# Altium footprint library 开关_按键封装库.PcbLib: 175 footprints (part 1 of 11)
Each footprint in its own frame and in the unit in brackets; x right, y up, seen from the top. Pads: shape width x height; smd on the part's side, far side on the other; paste and mask are expansions set on the pad; w line width, h text height; cw(c..) or ccw(c..) is an arc to the next point about the centre after c.
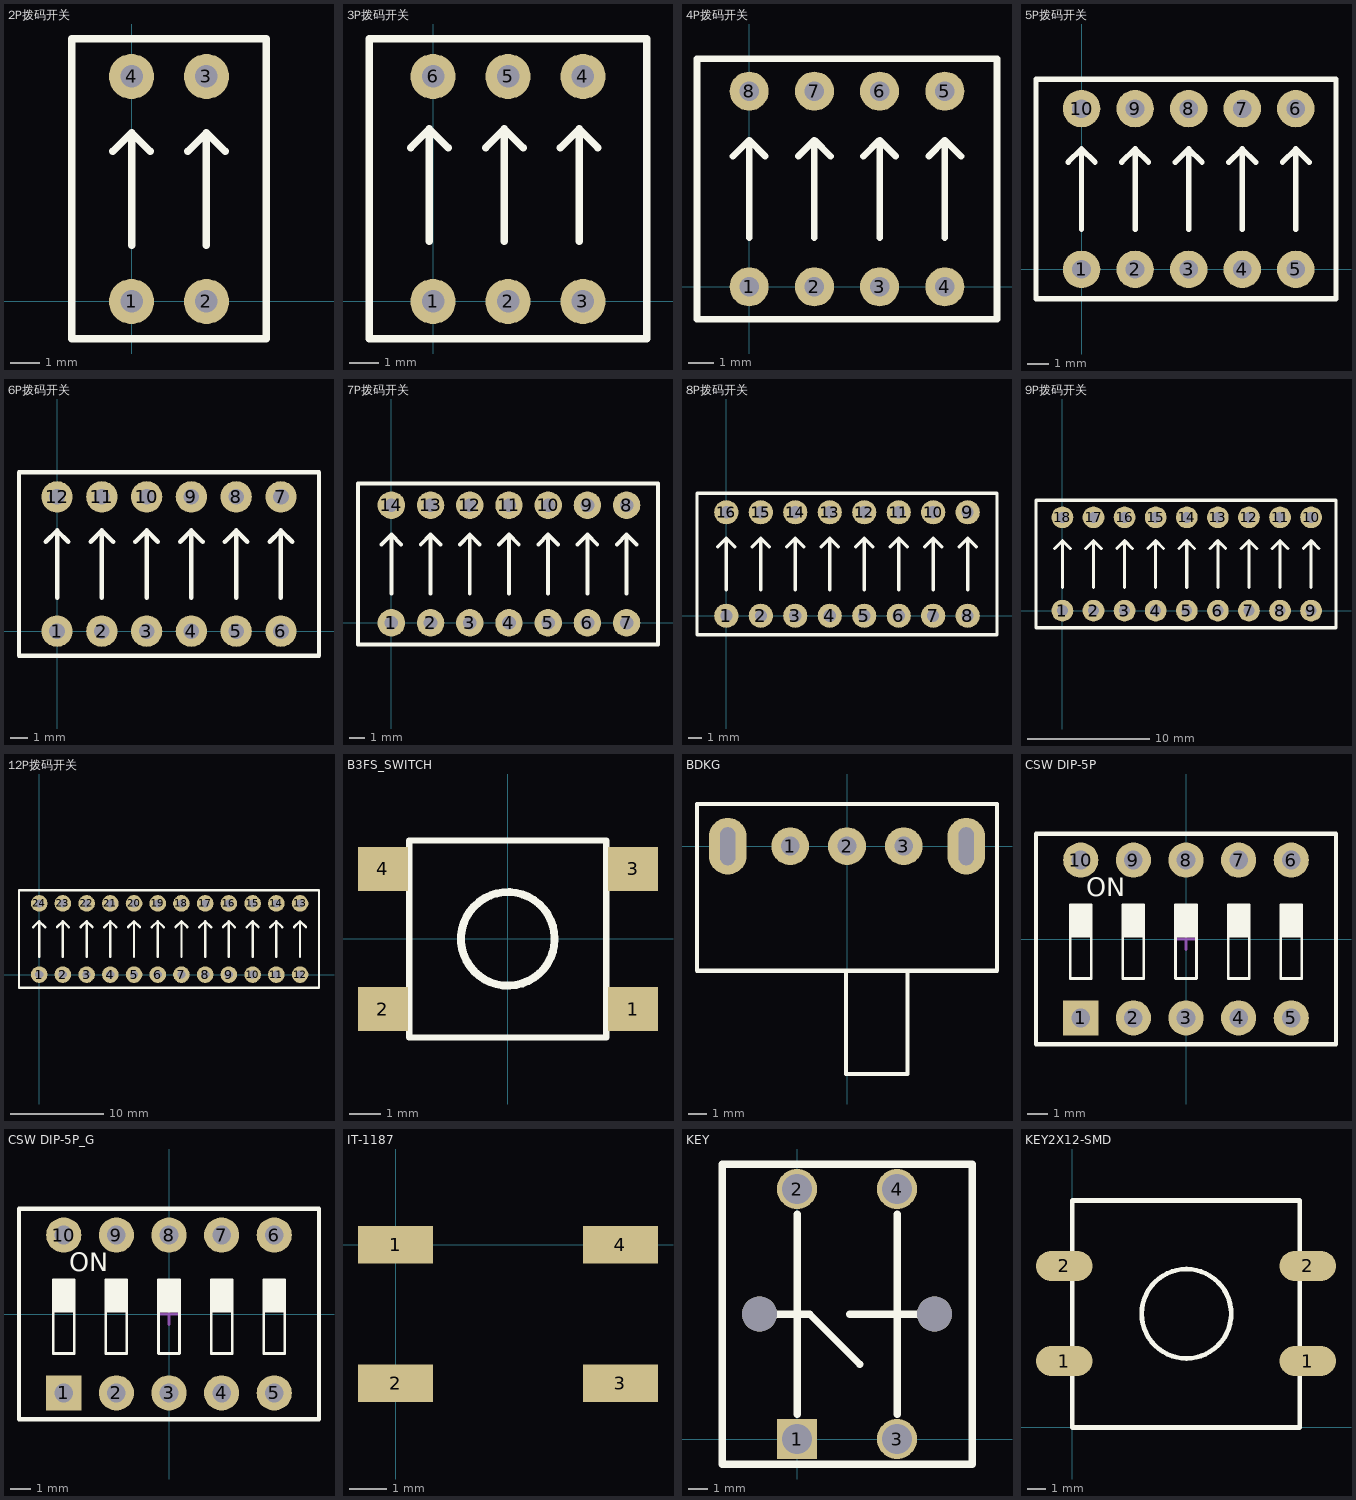
[diagram p0: the footprints below, top view; thin cyan lines are the x and y axes]

## 2P拨码开关 [mil]
pads (4):
  round 60 hole 30: 1(0,0) 2(100,0) 3(100,300) 4(0,300)
Top Overlay:
  lines w10: -25,200 0,225 ; 0,75 0,225 ; 25,200 0,225 ; 75,200 100,225 ; 100,75 100,225 ; 125,200 100,225 ; -80,-50 180,-50 180,350 -80,350 -80,-50
3D body "SW3dPS-DIPSWITCH.STEP": height 271.65, standoff -125.98, extent -79.92,-50 179.92,350

## 3P拨码开关 [mil]
pads (6):
  round 60 hole 30: 1(0,0) 2(100,0) 3(200,0) 4(200,300) 5(100,300) 6(0,300)
Top Overlay:
  lines w10: -30,205 -5,230 ; -5,80 -5,230 ; 20,205 -5,230 ; 70,205 95,230 ; 95,80 95,230 ; 120,205 95,230 ; 170,205 195,230 ; 195,80 195,230 ; 220,205 195,230 ; -85,-50 -85,350 285,350 285,-50 -85,-50
3D body "19620.stp": height 242.2, standoff -120, extent -80.7,-44.88 280.72,344.89

## 4P拨码开关 [mil]
pads (8):
  round 60 hole 30: 1(0,0) 2(100,0) 3(200,0) 4(300,0) 5(300,300) 6(200,300) 7(100,300) 8(0,300)
Top Overlay:
  lines w10: -25,200 0,225 ; 0,75 0,225 ; 25,200 0,225 ; 75,200 100,225 ; 100,75 100,225 ; 125,200 100,225 ; 175,200 200,225 ; 200,75 200,225 ; 225,200 200,225 ; 275,200 300,225 ; 300,75 300,225 ; 325,200 300,225 ; -80,-50 380,-50 380,350 -80,350 -80,-50
3D body "SW3dPS-DIPSWITCH.STEP": height 271.65, standoff -125.98, extent -79.92,-50 179.92,350
3D body "SW3dPS-DIPSWITCH.STEP": height 271.65, standoff -125.98, extent 120.08,-50 379.92,350

## 5P拨码开关 [mil]
pads (10):
  round 70 hole 35: 1(0,0) 2(100,0) 3(200,0) 4(300,0) 5(400,0) 6(400,300) 7(300,300) 8(200,300) 9(100,300) 10(0,300)
Top Overlay:
  lines w10: -25,200 0,225 ; 0,75 0,225 ; 25,200 0,225 ; 75,200 100,225 ; 100,75 100,225 ; 125,200 100,225 ; 175,200 200,225 ; 200,75 200,225 ; 225,200 200,225 ; 275,200 300,225 ; 300,75 300,225 ; 325,200 300,225 ; 375,200 400,225 ; 400,75 400,225 ; 425,200 400,225 ; -85,-55 -85,355 475,355 475,-55 -85,-55
3D body "User Library-DIP-Switch.STEP": height 275.59, standoff -145.67, extent -69.68,-45 469.68,344.77

## 6P拨码开关 [mil]
pads (12):
  round 70 hole 35: 1(0,0) 2(100,0) 3(200,0) 4(300,0) 5(400,0) 6(500,0) 7(500,300) 8(400,300) 9(300,300) 10(200,300) 11(100,300) 12(0,300)
Top Overlay:
  lines w10: -25,200 0,225 ; 0,75 0,225 ; 25,200 0,225 ; 75,200 100,225 ; 100,75 100,225 ; 125,200 100,225 ; 175,200 200,225 ; 200,75 200,225 ; 225,200 200,225 ; 275,200 300,225 ; 300,75 300,225 ; 325,200 300,225 ; 375,200 400,225 ; 400,75 400,225 ; 425,200 400,225 ; 475,200 500,225 ; 500,75 500,225 ; 525,200 500,225 ; -85,-55 -85,355 585,355 585,-55 -85,-55
3D body "User Library-DIPSWITCH (1).step": height 271.65, standoff -125.98, extent -79.92,-50 579.92,350

## 7P拨码开关 [mil]
pads (14):
  round 70 hole 35: 1(0,0) 2(100,0) 3(200,0) 4(300,0) 5(400,0) 6(500,0) 7(600,0) 8(600,300) 9(500,300) 10(400,300) 11(300,300) 12(200,300) 13(100,300) 14(0,300)
Top Overlay:
  lines w10: -25,200 0,225 ; 0,75 0,225 ; 25,200 0,225 ; 75,200 100,225 ; 100,75 100,225 ; 125,200 100,225 ; 175,200 200,225 ; 200,75 200,225 ; 225,200 200,225 ; 275,200 300,225 ; 300,75 300,225 ; 325,200 300,225 ; 375,200 400,225 ; 400,75 400,225 ; 425,200 400,225 ; 475,200 500,225 ; 500,75 500,225 ; 525,200 500,225 ; 575,200 600,225 ; 600,75 600,225 ; 625,200 600,225 ; -85,-55 -85,355 680,355 680,-55 -85,-55
3D body "User Library-DIPSWITCH7.step": height 271.65, standoff -125.98, extent -78.55,-50 675,350

## 8P拨码开关 [mil]
pads (16):
  round 70 hole 35: 1(0,0) 2(100,0) 3(200,0) 4(300,0) 5(400,0) 6(500,0) 7(600,0) 8(700,0) 9(700,300) 10(600,300) 11(500,300) 12(400,300) 13(300,300) 14(200,300) 15(100,300) 16(0,300)
Top Overlay:
  lines w10: -25,200 0,225 ; 0,75 0,225 ; 25,200 0,225 ; 75,200 100,225 ; 100,75 100,225 ; 125,200 100,225 ; 175,200 200,225 ; 200,75 200,225 ; 225,200 200,225 ; 275,200 300,225 ; 300,75 300,225 ; 325,200 300,225 ; 375,200 400,225 ; 400,75 400,225 ; 425,200 400,225 ; 475,200 500,225 ; 500,75 500,225 ; 525,200 500,225 ; 575,200 600,225 ; 600,75 600,225 ; 625,200 600,225 ; 675,200 700,225 ; 700,75 700,225 ; 725,200 700,225 ; -85,-55 785,-55 785,355 -85,355 -85,-55
3D body "User Library-DIPSWITCH8.step": height 281.65, standoff -115.98, extent -81.1,-50 781.1,350

## 9P拨码开关 [mil]
pads (18):
  round 70 hole 35: 1(0,0) 2(100,0) 3(200,0) 4(300,0) 5(400,0) 6(500,0) 7(600,0) 8(700,0) 9(800,0) 10(800,300) 11(700,300) 12(600,300) 13(500,300) 14(400,300) 15(300,300) 16(200,300) 17(100,300) 18(0,300)
Top Overlay:
  lines w10: -25,200 0,225 ; 0,75 0,225 ; 25,200 0,225 ; 75,200 100,225 ; 100,75 100,225 ; 125,200 100,225 ; 175,200 200,225 ; 200,75 200,225 ; 225,200 200,225 ; 275,200 300,225 ; 300,75 300,225 ; 325,200 300,225 ; 375,200 400,225 ; 400,75 400,225 ; 425,200 400,225 ; 475,200 500,225 ; 500,75 500,225 ; 525,200 500,225 ; 575,200 600,225 ; 600,75 600,225 ; 625,200 600,225 ; 675,200 700,225 ; 700,75 700,225 ; 725,200 700,225 ; 775,200 800,225 ; 800,75 800,225 ; 825,200 800,225 ; -85,-55 -85,355 880,355 880,-55 -85,-55
3D body "User Library-DIPSWITCH9.step": height 271.65, standoff -125.98, extent -78.55,-50 875,350

## 12P拨码开关 [mil]
pads (24):
  round 70 hole 35: 1(0,0) 2(100,0) 3(200,0) 4(300,0) 5(400,0) 6(500,0) 7(600,0) 8(700,0) 9(800,0) 10(900,0) 11(1000,0) 12(1100,0) 13(1100,300) 14(1000,300) 15(900,300) 16(800,300) 17(700,300) 18(600,300) 19(500,300) 20(400,300) 21(300,300) 22(200,300) 23(100,300) 24(0,300)
Top Overlay:
  lines w10: -25,200 0,225 ; 0,75 0,225 ; 25,200 0,225 ; 75,200 100,225 ; 100,75 100,225 ; 125,200 100,225 ; 175,200 200,225 ; 200,75 200,225 ; 225,200 200,225 ; 275,200 300,225 ; 300,75 300,225 ; 325,200 300,225 ; 375,200 400,225 ; 400,75 400,225 ; 425,200 400,225 ; 475,200 500,225 ; 500,75 500,225 ; 525,200 500,225 ; 575,200 600,225 ; 600,75 600,225 ; 625,200 600,225 ; 675,200 700,225 ; 700,75 700,225 ; 725,200 700,225 ; 775,200 800,225 ; 800,75 800,225 ; 825,200 800,225 ; 875,200 900,225 ; 900,75 900,225 ; 925,200 900,225 ; 975,200 1000,225 ; 1000,75 1000,225 ; 1025,200 1000,225 ; 1075,200 1100,225 ; 1100,75 1100,225 ; 1125,200 1100,225 ; -85,-55 -85,355 1180,355 1180,-55 -85,-55
3D body "User Library-DIPSWITCH12.step": height 271.65, standoff -125.98, extent -78.55,-50 1175,350

## B3FS_SWITCH [mm]
height 1
pads (4):
  rect 1.6x1.4 smd: 1(4.01,-2.25) 2(-4,-2.25) 3(4.01,2.24) 4(-4,2.24)
Top Overlay:
  circle w0.254: c0,0 r1.5
  lines w0.2: -3.16,-3.16 -3.16,3.15 3.15,3.15 3.15,-3.16 -3.16,-3.16

## BDKG [mm]
pads (5):
  round 2 hole 1: 1(-3,0) 2(0,0) 3(3,0)
  oval 2x3 hole 0.8 slot 2 at 90 deg: ""(-6.3,0) ""(6.3,0)
Top Overlay:
  lines w0.203: -0.051,-6.579 -0.051,-12.04 3.2,-12.04 3.2,-6.579
  lines w0.22: -7.925,-6.579 -7.925,2.235 7.925,2.235 7.925,-6.579 -7.925,-6.579
3D body "bodongkuaiguan.STEP": height 6.25, standoff -2.85, extent -6.489,-12.266 6.511,0.634

## CSW DIP-5P [mm] "14.2*9.9*7mm"
pads (10):
  rect 1.7x1.7 hole 0.9: 1(-5.08,-3.81)
  round 1.7 hole 0.9: 2(-2.54,-3.81) 3(0,-3.81) 4(2.54,-3.81) 5(5.08,-3.81) 6(5.08,3.81) 7(2.54,3.81) 8(0,3.81) 9(-2.54,3.81) 10(-5.08,3.81)
Top Overlay:
  rectangle: -5.588,0.127 -4.572,1.651
  rectangle: -3.048,0.127 -2.032,1.651
  rectangle: -0.508,0.127 0.508,1.651
  rectangle: 2.032,0.127 3.048,1.651
  rectangle: 4.572,0.127 5.588,1.651
  lines w0.127: -5.588,0.127 -4.572,0.127 ; -3.048,0.127 -2.032,0.127 ; -0.508,0.127 0.508,0.127 ; 2.032,0.127 3.048,0.127 ; 4.572,0.127 5.588,0.127 ; -5.588,-1.905 -5.588,1.651 -4.572,1.651 -4.572,-1.905 -5.588,-1.905 ; -3.048,-1.905 -3.048,1.651 -2.032,1.651 -2.032,-1.905 -3.048,-1.905 ; -0.508,-1.905 -0.508,1.651 0.508,1.651 0.508,-1.905 -0.508,-1.905 ; 2.032,-1.905 2.032,1.651 3.048,1.651 3.048,-1.905 2.032,-1.905 ; 4.572,-1.905 4.572,1.651 5.588,1.651 5.588,-1.905 4.572,-1.905
  lines w0.2: -7.239,-5.08 -7.239,5.08 7.239,5.08 7.239,-5.08 -7.239,-5.08
  text "ON" at -4.826,1.778 h1.52
Mechanical 15:
  lines w0.15: -0.508,0 0.508,0 ; 0,-0.508 0,0.508
3D body "CSW DIP-5P.STEP": height 6.65, standoff -3.15, extent -7.13,-4.95 7.13,4.95

## CSW DIP-5P_G [mm] "14.2*9.9*7mm"
pads (10):
  rect 1.7x1.7 hole 0.9: 1(-5.08,-3.81)
  round 1.7 hole 0.9: 2(-2.54,-3.81) 3(0,-3.81) 4(2.54,-3.81) 5(5.08,-3.81) 6(5.08,3.81) 7(2.54,3.81) 8(0,3.81) 9(-2.54,3.81) 10(-5.08,3.81)
Top Overlay:
  rectangle: 4.572,0.127 5.588,1.651
  rectangle: 2.032,0.127 3.048,1.651
  rectangle: -0.508,0.127 0.508,1.651
  rectangle: -3.048,0.127 -2.032,1.651
  rectangle: -5.588,0.127 -4.572,1.651
  lines w0.127: -5.588,0.127 -4.572,0.127 ; -3.048,0.127 -2.032,0.127 ; -0.508,0.127 0.508,0.127 ; 2.032,0.127 3.048,0.127 ; 4.572,0.127 5.588,0.127 ; -5.588,-1.905 -4.572,-1.905 -4.572,1.651 -5.588,1.651 -5.588,-1.905 ; -3.048,-1.905 -2.032,-1.905 -2.032,1.651 -3.048,1.651 -3.048,-1.905 ; -0.508,-1.905 0.508,-1.905 0.508,1.651 -0.508,1.651 -0.508,-1.905 ; 2.032,-1.905 3.048,-1.905 3.048,1.651 2.032,1.651 2.032,-1.905 ; 4.572,-1.905 5.588,-1.905 5.588,1.651 4.572,1.651 4.572,-1.905
  lines w0.2: -7.239,-5.08 7.239,-5.08 7.239,5.08 -7.239,5.08 -7.239,-5.08
  text "ON" at -4.826,1.778 h1.52
Mechanical 15:
  lines w0.15: -0.508,0 0.508,0 ; 0,-0.508 0,0.508
3D body "CSW DIP-5P_G.STEP": height 6.65, standoff -3.15, extent -7.13,-4.95 7.13,4.95

## IT-1187 [mm]
pads (4):
  rect 2x1 smd: 1(0,0) 2(0,-3.7) 3(6,-3.7) 4(6,0)
3D body "User Library-IT-1187.STEP": height 1.5, standoff 0, extent -0.254,-4.454 6.146,0.746

## KEY [mil]
pads (6):
  rect 80x80 hole 60: 1(0,0)
  round 80 hole 60: 2(0,500) 3(200,0) 4(200,500)
  round 70 hole 70: ""(-75,250) ""(275,250)
Top Overlay:
  lines w15: -50,250 25,250 125,150 ; 0,50 0,450 ; 105,250 275,250 ; 200,50 200,450 ; -150,-50 -150,550 -125,550 350,550 350,250 350,-50 -150,-50

## KEY2X12-SMD [mm]
pads (4):
  oval 3x1.6 smd: 1(-0.43,3.532) 1(12.524,3.532) 2(-0.43,8.588) 2(12.524,8.588)
Top Overlay:
  circle w0.254: c6.071,6.045 r2.378
  lines w0.254: 0,0 0,12.065 12.09,12.065 12.09,0 0,0
3D body "User Library-SWT_12x12_SMD.step": height 4, standoff 0, extent -0.629,0.065 12.821,12.065